# Altium footprint library My Library.PcbLib: 872 footprints (part 53 of 55)
Each footprint in its own frame and in the unit in brackets; x right, y up, seen from the top. Pads: shape width x height; smd on the part's side, far side on the other; paste and mask are expansions set on the pad; w line width, h text height; cw(c..) or ccw(c..) is an arc to the next point about the centre after c.
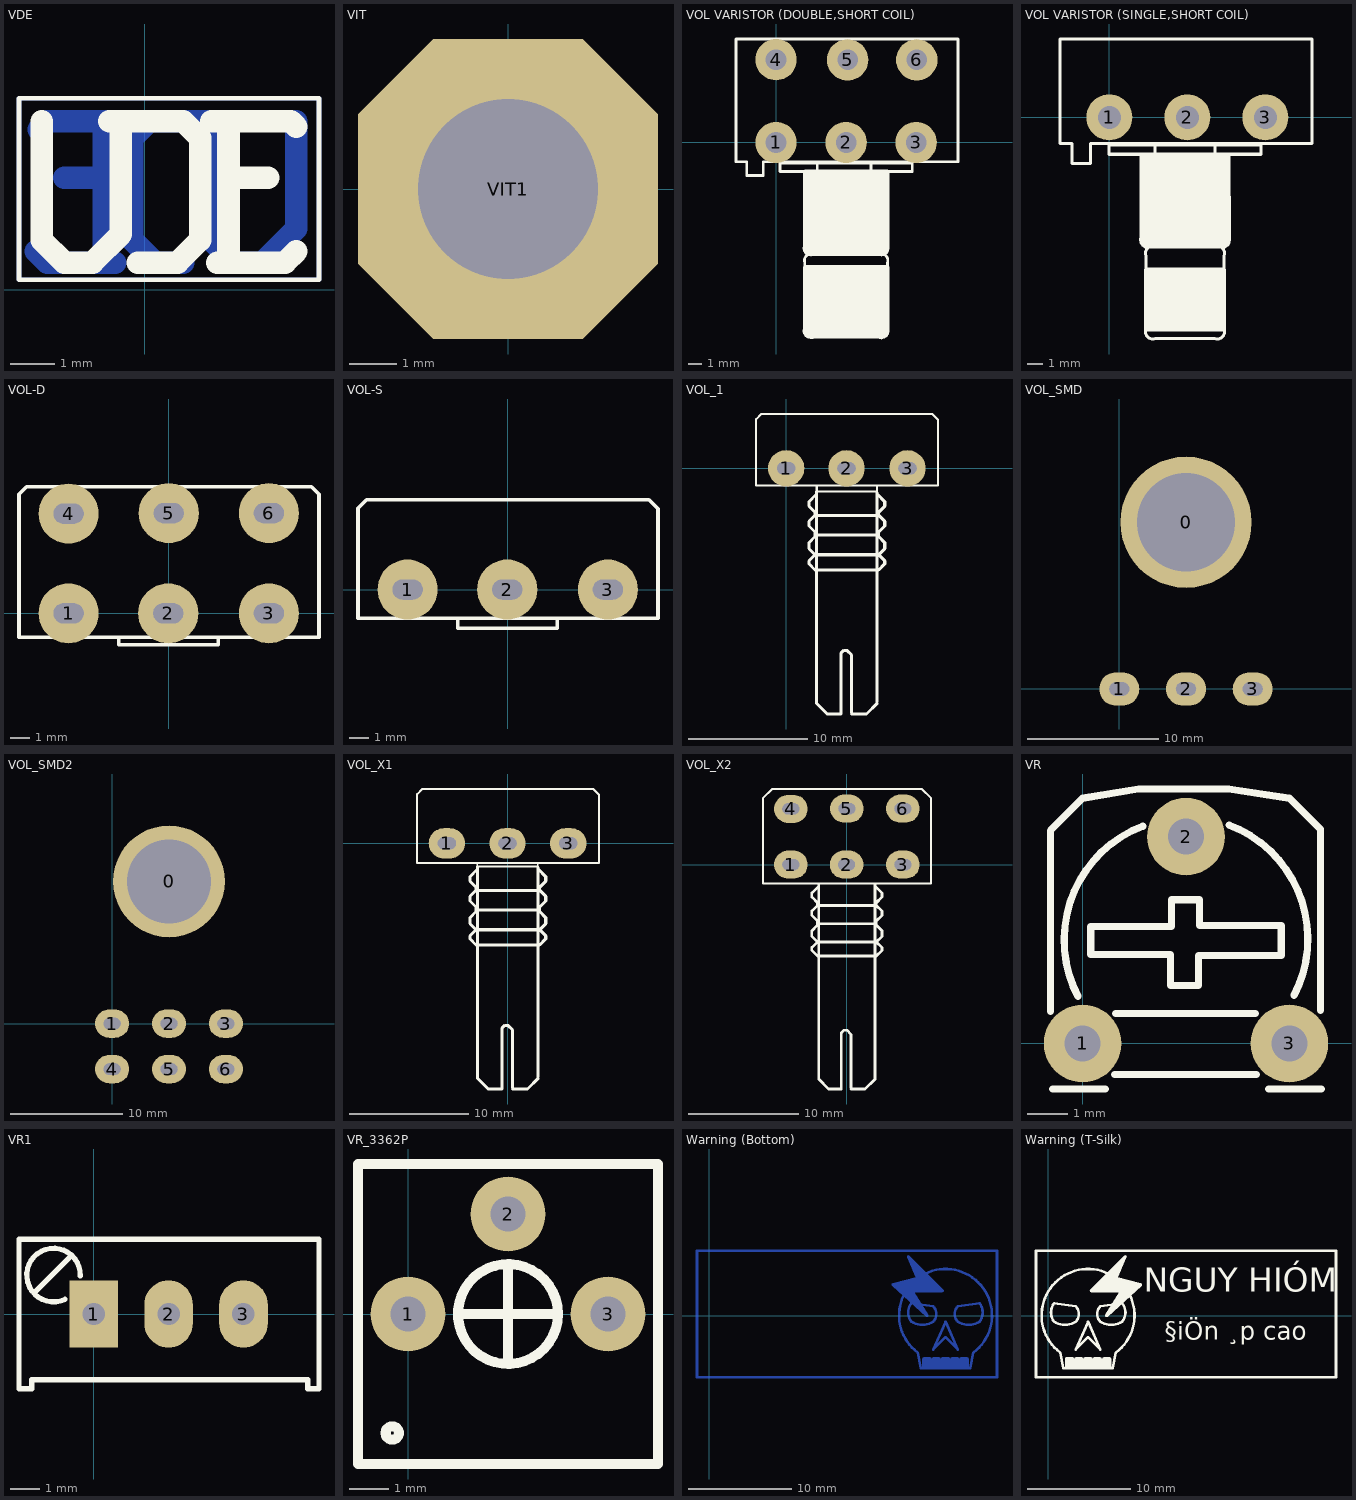
[diagram p52: the footprints below, top view; thin cyan lines are the x and y axes]

## VDE [mm] "VDE - SM"
Bottom Layer:
  lines w0.102: -2.819,0.229 -2.819,4.293 3.912,4.293 3.912,0.229 -2.819,0.229
  lines w0.508: -2.438,0.864 -2.184,0.61 -1.803,0.61 -0.914,0.61 -0.914,3.785 -2.184,3.785 -2.375,3.594 ; -1.803,2.515 -0.914,2.515 ; -1.549,3.785 -0.533,3.785 ; -1.295,0.61 -0.66,0.61 ; 0.864,0.61 0.229,0.61 -0.279,1.118 -0.279,3.404 0.102,3.785 1.753,3.785 ; 1.372,3.785 1.372,1.245 2.007,0.61 2.642,0.61 3.404,1.372 3.404,3.785
Top Overlay:
  lines w0.102: -2.819,0.229 3.912,0.229 3.912,4.293 -2.819,4.293 -2.819,0.229
  lines w0.508: -2.311,3.785 -2.311,1.118 -1.803,0.61 -1.549,0.61 -1.422,0.61 -1.168,0.61 -0.533,1.245 -0.533,3.785 0.864,3.785 1.245,3.404 1.245,1.118 0.737,0.61 -0.152,0.61 ; -0.787,3.785 0.229,3.785 ; 1.499,3.785 2.261,3.785 ; 1.626,0.61 3.15,0.61 3.404,0.864 ; 1.88,0.864 1.88,3.785 3.277,3.785 3.404,3.658 ; 1.88,2.515 2.769,2.515

## VIT [mm] "VIT"
height 0.005
pads (1):
  oct 6.35x6.35 hole 3.81: VIT1(0,0)

## VOL VARISTOR (DOUBLE,SHORT COIL) [mm]
pads (6):
  round 3 hole 1.5: 1(0,0) 2(5.08,0) 3(10.16,0) 4(0,6.003) 5(5.19,5.991) 6(10.201,5.991)
Top Overlay:
  region: 8.119,-2.009 8.158,-2.024 8.158,-2.025 8.174,-2.063 8.19,-2.101 8.193,-7.492 8.221,-7.632 8.217,-7.653 8.221,-7.675 8.184,-7.86 8.172,-7.878 8.168,-7.899 8.063,-8.056 8.045,-8.068 8.033,-8.086 7.876,-8.191 7.855,-8.195 7.837,-8.207 7.652,-8.244 7.631,-8.239 7.61,-8.244 7.459,-8.213 7.457,-8.212 2.691,-8.216 2.55,-8.244 2.529,-8.239 2.507,-8.244 2.322,-8.207 2.304,-8.195 2.283,-8.191 2.126,-8.086 2.114,-8.068 2.096,-8.056 1.991,-7.899 1.987,-7.878 1.975,-7.86 1.938,-7.675 1.943,-7.653 1.938,-7.632 1.968,-7.481 1.97,-7.478 1.97,-2.101 2.002,-2.025 2.079,-1.993 8.081,-1.993
  region: 8.158,-8.928 8.19,-9.004 8.19,-13.482 8.191,-13.484 8.221,-13.635 8.217,-13.656 8.221,-13.677 8.184,-13.863 8.172,-13.881 8.168,-13.902 8.063,-14.059 8.045,-14.071 8.033,-14.088 7.876,-14.193 7.855,-14.198 7.837,-14.21 7.652,-14.246 7.631,-14.242 7.61,-14.246 7.469,-14.218 2.703,-14.214 2.701,-14.216 2.55,-14.246 2.529,-14.242 2.507,-14.246 2.322,-14.209 2.305,-14.197 2.283,-14.193 2.127,-14.088 2.115,-14.07 2.097,-14.058 1.992,-13.901 1.988,-13.88 1.976,-13.862 1.939,-13.677 1.943,-13.656 1.939,-13.635 1.969,-13.484 1.97,-13.482 1.97,-9.004 2.002,-8.928 2.079,-8.896 8.081,-8.896
  lines w0.2: 2.679,-14.107 7.481,-14.107 ccw(c7.631,-13.656) 8.081,-13.506 8.081,-8.704 ccw(c7.631,-8.554) 7.481,-8.103 ; 2.679,-14.106 cw(c2.529,-13.656) 2.079,-13.506 2.079,-8.704 cw(c2.529,-8.554) 2.679,-8.104 ; 2.679,-8.103 cw(c2.529,-7.653) 2.079,-7.504 2.079,-2.101 8.081,-2.101 8.081,-7.504 cw(c7.631,-7.653) 7.481,-8.104 ; 2.679,-8.104 7.481,-8.104 ; 2.679,-8.104 7.481,-8.104 ; -2.897,-1.4 -2.123,-1.4 -2.123,-2.399 -0.923,-2.399 -0.923,-1.4 13.184,-1.4 13.184,7.504 -2.897,7.504 -2.897,-1.4 ; 0.278,-2.101 9.882,-2.101 9.882,-1.501 0.278,-1.501 0.278,-2.101 ; 2.979,-2.101 2.979,-1.501 6.881,-1.501 6.881,-2.101 2.979,-2.101

## VOL VARISTOR (SINGLE,SHORT COIL) [mm]
pads (3):
  round 3 hole 1.5: 1(0,0) 2(5.08,0) 3(10.16,0)
Top Overlay:
  region: 7.558,-9.828 7.589,-9.905 7.589,-13.807 7.558,-13.883 7.481,-13.915 2.379,-13.915 2.302,-13.883 2.271,-13.807 2.271,-9.905 2.302,-9.828 2.379,-9.797 7.481,-9.797
  region: 7.819,-2.309 7.858,-2.325 7.874,-2.363 7.889,-2.401 7.893,-7.792 7.921,-7.932 7.917,-7.954 7.921,-7.975 7.884,-8.16 7.872,-8.178 7.868,-8.199 7.763,-8.356 7.745,-8.368 7.733,-8.386 7.576,-8.491 7.555,-8.495 7.537,-8.507 7.352,-8.544 7.331,-8.539 7.31,-8.544 7.159,-8.514 7.157,-8.512 2.691,-8.516 2.55,-8.544 2.529,-8.54 2.507,-8.544 2.322,-8.507 2.304,-8.495 2.283,-8.491 2.126,-8.386 2.114,-8.368 2.096,-8.356 1.991,-8.199 1.987,-8.178 1.975,-8.16 1.938,-7.975 1.943,-7.954 1.938,-7.932 1.968,-7.781 1.97,-7.778 1.97,-2.401 2.002,-2.325 2.079,-2.293 7.781,-2.293
  lines w0.2: 2.078,-7.804 ccw(c2.529,-7.954) 2.679,-8.404 7.181,-8.404 ccw(c7.331,-7.954) 7.781,-7.804 7.781,-2.401 2.079,-2.401 2.079,-7.804 ; -3.197,-1.7 -2.424,-1.7 -2.424,-3.001 -1.223,-3.001 -1.223,-1.7 13.184,-1.7 13.184,5.102 -3.197,5.102 -3.197,-1.7 ; -0.022,-2.401 -0.022,-1.801 9.882,-1.801 9.882,-2.401 -0.022,-2.401 ; 2.379,-13.807 ccw(c2.829,-13.956) 2.979,-14.406 6.881,-14.407 ccw(c7.031,-13.956) 7.481,-13.807 7.481,-9.004 ccw(c7.031,-8.854) 6.881,-8.404 2.979,-8.404 ccw(c2.829,-8.854) 2.379,-9.004 2.379,-13.807 ; 2.979,-2.401 6.881,-2.401 6.881,-1.801 2.979,-1.801 2.979,-2.401

## VOL-D [mil] "Volume control Dual"
height 400
pads (6):
  round 120 hole 40 slot 60 at 0 deg: 1(-200,0) 2(-1,0) 3(200,0) 4(-200,199) 5(0,200) 6(200,200)
Top Overlay:
  lines w7: -100,-48 -100,-63 99,-63 99,-48 ; -299,-48 300,-48 300,238 285,253 -284,253 -299,238 -299,-48
3D body "SW3dPS-ALPHA-potentiometer stereo PCB mount.STEP": height 834.65, standoff -129.92, extent -338.65,-1309.27 330.65,299

## VOL-S [mil] "Volume control single"
height 400
pads (3):
  round 120 hole 40 slot 60 at 0 deg: 1(-200,0) 2(-1,0) 3(200,0)
Top Overlay:
  lines w7: -100,-57 -100,-77 99,-77 99,-57 ; -299,-57 -299,162 -282,179 282,179 300,161 300,-57 -299,-57

## VOL_1 [mil]
pads (3):
  round 120 hole 40 slot 60 at 0 deg: 1(0,0) 2(199,0) 3(400,0)
Top Overlay:
  lines w7: 100,-57 100,-77 299,-77 299,-57 ; 101,-77 101,-57 ; -99,-57 500,-57 500,161 482,179 -82,179 -99,162 -99,-57
  lines w10: 95,-335 75,-315 75,-305 95,-285 75,-265 75,-245 95,-225 95,-210 75,-190 75,-175 95,-155 95,-145 75,-125 75,-110 100,-85 ; 95,-220 300,-220 ; 100,-770 100,-77 ; 100,-760 100,-775 135,-810 180,-810 180,-610 190,-600 200,-600 215,-615 215,-805 ; 100,-335 305,-335 325,-315 325,-305 305,-285 ; 100,-285 305,-285 ; 105,-155 300,-155 ; 215,-810 265,-810 300,-775 ; 300,-770 300,-80 ; 300,-85 325,-110 325,-125 305,-145 305,-155 325,-175 325,-190 305,-210 305,-225 325,-245 325,-265 305,-285
3D body "SW3dPS-Pot.STEP": height 839.35, standoff -130, extent -110,-818.11 510,188.11

## VOL_SMD [mil]
pads (4):
  round 393.7 hole 295.28: 0(200,500)
  oval 120x100 hole 40 slot 60 at 0 deg: 1(0,0) 2(200,0) 3(400,0)
Bottom Overlay:
  circle w12: c200,500 r215.01
  circle w12: c0,150 r50
  circle w12: c200,150 r50
  circle w12: c400,150 r50
  lines w12: -57.25,301.71 cw(c200,500) 455.57,299.55 ; -55,299 127,299 ; -49,700 119,700 ; 281,298 455,298 ; 286,698 454,698 ; 455,295 500,250 500,-75 -100,-75 -100,255 ; -100,255 -55,300 -100,255
3D body "SW3dPS-omeg pot.STEP": height 866.14, standoff -407.48, extent -203.15,-247.08 600,947.08

## VOL_SMD2 [mil]
pads (7):
  round 393.7 hole 295.28: 0(200,500)
  oval 120x100 hole 40 slot 60 at 0 deg: 1(0,0) 2(200,0) 3(400,0) 4(0,-160) 5(200,-160) 6(400,-160)
Bottom Overlay:
  circle w12: c400,150 r50
  circle w12: c200,150 r50
  circle w12: c0,150 r50
  circle w12: c200,500 r215.01
  lines w12: -100,-70 -100,-230 500,-230 500,-70 ; -57.25,301.71 cw(c200,500) 455.57,299.55 ; -55,299 127,299 ; -49,700 119,700 ; 281,298 455,298 ; 286,698 454,698 ; 455,295 500,250 500,-75 -100,-75 -100,255 ; -100,255 -55,300 -100,255

## VOL_X1 [mil]
pads (3):
  oval 120x100 hole 40 slot 60 at 0 deg: 1(-200,0) 2(0,0) 3(200,0)
Top Overlay:
  lines w5: -100,-65 -100,-77 -99,-77 ; 100,-77 100,-65
  lines w7: -99,-77 100,-77 ; -298,-65 301,-65 301,161 283,179 -281,179 -298,162 -298,-65
  lines w10: -104,-335 -124,-315 -124,-305 -104,-285 -124,-265 -124,-245 -104,-225 -104,-210 -124,-190 -124,-175 -104,-155 -104,-145 -124,-125 -124,-110 -99,-85 ; -104,-220 101,-220 ; -99,-770 -99,-77 ; -99,-760 -99,-775 -64,-810 -19,-810 -19,-610 -9,-600 1,-600 16,-615 16,-805 ; -99,-335 106,-335 126,-315 126,-305 106,-285 ; -99,-285 106,-285 ; -94,-155 101,-155 ; 16,-810 66,-810 101,-775 ; 101,-770 101,-80 ; 101,-85 126,-110 126,-125 106,-145 106,-155 126,-175 126,-190 106,-210 106,-225 126,-245 126,-265 106,-285
3D body "SW3dPS-Pot.STEP": height 839.35, standoff -130, extent -310,-812.22 310,194

## VOL_X2 [mil] "Volume control Dual"
height 400
pads (6):
  oval 120x100 hole 40 slot 60 at 0 deg: 1(-200,0) 2(-1,0) 3(200,0) 4(-200,199) 5(0,200) 6(200,200)
Top Overlay:
  lines w7: -299,-68 -299,238 -267,270 268,270 300,238 300,-68 -299,-68
  lines w10: -105,-326 -125,-306 -125,-296 -105,-276 -125,-256 -125,-236 -105,-216 -105,-201 -125,-181 -125,-166 -105,-146 -105,-136 -125,-116 -125,-101 -100,-76 ; -105,-211 100,-211 ; -100,-761 -100,-68 ; -100,-751 -100,-766 -65,-801 -20,-801 -20,-601 -10,-591 0,-591 15,-606 15,-796 ; -100,-326 105,-326 125,-306 125,-296 105,-276 ; -100,-276 105,-276 ; -95,-146 100,-146 ; 15,-801 65,-801 100,-766 ; 100,-761 100,-71 ; 100,-76 125,-101 125,-116 105,-136 105,-146 125,-166 125,-181 105,-201 105,-216 125,-236 125,-256 105,-276
3D body "SW3dPS-ALPHA-potentiometer stereo PCB mount.STEP": height 834.65, standoff -129.92, extent -335.64,-1325.41 333.65,282.86

## VR [mil] "Resistor Variable"
height 200
pads (3):
  round 75 hole 35: 1(0,0) 2(100,200) 3(200,0)
Top Overlay:
  lines w7: -31,31 -31,206 0,237 54,246 141.5,246 200,237 230,207 230,32 ; -29,-44 22,-44 ; -4.35,45.34 cw(c100,100) 58.1,210.1 ; 8,113 8,86 85,86 85,56 112,56 112,85 192,85 192,114 113,114 113,139 86,139 86,113 9,113 ; 31,-30 168,-30 ; 32,29 167,29 ; 141.9,211.1 cw(c100,101) 204.35,46.34 ; 180,-44 231,-44
3D body "SW3dPS-Trimpot Horizontal.STEP": height 165.35, standoff -220.47, extent -86.85,-30 306.85,371.57

## VR1 [mil] "Variable Resistor"
height 400
pads (3):
  rect 65x90 hole 30: 1(0,0)
  oval 65x90 hole 30: 2(100,0) 3(200,0)
Top Overlay:
  lines w7: -80,28 -30,78 ; -38.6,19.63 cw(c-53.79,52.05) -18.01,50.77 ; -100,-100 -100,100 301,100 301,-100 286,-100 286,-88 -83,-88 -83,-100 -100,-100
3D body "SW3dPS-Bourns_3299W.STEP": height 455, standoff -45, extent -87.5,-130 287.5,110

## VR_3362P [mil] "Resistor Variable"
height 200
pads (3):
  round 75 hole 35: 1(0,0) 2(100,100) 3(200,0)
Top Overlay:
  circle w10: c100,0 r50
  circle w10: c-15.71,-119 r6.71
  lines w10: 50,0 150,0 ; 100,-50 100,50 ; -50,-150 -50,150 250,150 250,-150 -50,-150
3D body "User Library-Bourns 3362P.STEP": height 185.04, standoff -215.35, extent -29.92,-147.79 229.92,129.92

## Warning (Bottom) [mm]
Bottom Layer:
  region: 22.544,-4.105 22.504,-4.202 22.504,-5.102 22.544,-5.2 22.641,-5.24 23.241,-5.24 23.338,-5.2 23.378,-5.102 23.378,-4.202 23.338,-4.105 23.241,-4.065 22.641,-4.065
  region: 23.444,-4.105 23.404,-4.202 23.404,-5.102 23.444,-5.2 23.542,-5.24 24.142,-5.24 24.239,-5.2 24.279,-5.102 24.279,-4.202 24.239,-4.105 24.142,-4.065 23.542,-4.065
  region: 20.743,-4.105 20.703,-4.202 20.703,-5.102 20.743,-5.2 20.84,-5.24 21.441,-5.24 21.538,-5.2 21.578,-5.102 21.578,-4.202 21.538,-4.105 21.441,-4.065 20.84,-4.065
  region: 21.644,-4.105 21.603,-4.202 21.603,-5.102 21.644,-5.2 21.741,-5.24 22.341,-5.24 22.438,-5.2 22.478,-5.102 22.478,-4.202 22.438,-4.105 22.341,-4.065 21.741,-4.065
  region: 24.345,-4.105 24.305,-4.202 24.305,-5.102 24.345,-5.2 24.442,-5.24 25.042,-5.24 25.139,-5.2 25.18,-5.102 25.18,-4.202 25.139,-4.105 25.042,-4.065 24.442,-4.065
  region: 19.314,5.829 19.285,5.829 19.267,5.81 19.242,5.8 19.232,5.774 19.212,5.754 19.212,5.727 19.202,5.703 19.213,5.677 19.213,5.649 20.05,3.696 17.806,3.135 17.773,3.111 17.737,3.094 17.732,3.081 17.721,3.073 17.715,3.033 17.702,2.995 17.708,2.983 17.705,2.969 17.729,2.936 17.746,2.9 21.048,-0.102 21.081,-0.114 21.11,-0.134 21.129,-0.131 21.147,-0.137 21.179,-0.122 21.213,-0.117 21.225,-0.101 21.242,-0.092 21.254,-0.059 21.274,-0.031 21.271,-0.012 21.278,0.007 21.263,0.038 21.257,0.073 19.888,2.264 22.641,2.264 22.738,2.304 22.779,2.401 22.738,2.498 19.437,5.8 19.411,5.811 19.391,5.83 19.364,5.83 19.34,5.84
  lines w0.254: -1.201,-6.003 -1.201,6.303 27.94,6.303 27.94,-6.003 -1.201,-6.003 ; 17.839,3.002 21.14,0 19.64,2.401 22.641,2.401 19.34,5.703 20.24,3.602 17.839,3.002 ; 19.64,-0.6 cw(c20.69,0.3) 19.64,1.201 21.741,0.9 cw(c20.991,0.15) 21.741,-0.6 cw(c20.69,1.05) 19.64,-0.6 ; 20.24,-3.602 cw(c22.941,0.014) 25.643,-3.602 25.342,-5.102 20.54,-5.102 20.24,-3.602 ; 21.741,-3.302 22.941,-2.101 24.142,-3.302 22.941,-0.6 21.741,-3.302 ; 24.142,-0.6 ccw(c25.193,1.05) 26.243,-0.6 ccw(c25.042,0.3) 26.243,1.201 24.142,0.9 ccw(c24.892,0.15) 24.142,-0.6
  text "NGUY HIÓM" at 17.526,1.143 h4
  text "§iÖn ¸p cao" at 14.732,-3.048 h3

## Warning (T-Silk) [mm]
Top Overlay:
  region: 7.483,5.829 7.512,5.829 7.53,5.81 7.555,5.8 7.565,5.774 7.585,5.754 7.585,5.727 7.595,5.703 7.584,5.677 7.584,5.649 6.747,3.696 8.991,3.135 9.024,3.111 9.06,3.094 9.065,3.081 9.076,3.073 9.082,3.033 9.095,2.995 9.089,2.983 9.092,2.969 9.068,2.936 9.051,2.9 5.749,-0.102 5.716,-0.114 5.687,-0.134 5.668,-0.131 5.65,-0.137 5.618,-0.122 5.584,-0.117 5.572,-0.101 5.555,-0.092 5.543,-0.059 5.523,-0.031 5.526,-0.012 5.519,0.007 5.534,0.038 5.54,0.073 6.909,2.264 4.156,2.264 4.059,2.304 4.018,2.401 4.059,2.498 7.36,5.8 7.386,5.811 7.406,5.83 7.433,5.83 7.457,5.84
  region: 2.452,-4.105 2.492,-4.202 2.492,-5.102 2.452,-5.2 2.355,-5.24 1.755,-5.24 1.658,-5.2 1.617,-5.102 1.617,-4.202 1.658,-4.105 1.755,-4.065 2.355,-4.065
  region: 5.153,-4.105 5.194,-4.202 5.194,-5.102 5.153,-5.2 5.056,-5.24 4.456,-5.24 4.359,-5.2 4.319,-5.102 4.319,-4.202 4.359,-4.105 4.456,-4.065 5.056,-4.065
  region: 6.054,-4.105 6.094,-4.202 6.094,-5.102 6.054,-5.2 5.957,-5.24 5.356,-5.24 5.259,-5.2 5.219,-5.102 5.219,-4.202 5.259,-4.105 5.356,-4.065 5.957,-4.065
  region: 3.353,-4.105 3.393,-4.202 3.393,-5.102 3.353,-5.2 3.255,-5.24 2.655,-5.24 2.558,-5.2 2.518,-5.102 2.518,-4.202 2.558,-4.105 2.655,-4.065 3.255,-4.065
  region: 4.253,-4.105 4.293,-4.202 4.293,-5.102 4.253,-5.2 4.156,-5.24 3.556,-5.24 3.459,-5.2 3.419,-5.102 3.419,-4.202 3.459,-4.105 3.556,-4.065 4.156,-4.065
  lines w0.254: -1.201,-6.003 27.94,-6.003 27.94,6.303 -1.201,6.303 -1.201,-6.003 ; 0.554,-0.6 cw(c1.755,0.3) 0.554,1.201 2.655,0.9 cw(c1.905,0.15) 2.655,-0.6 cw(c1.604,1.05) 0.554,-0.6 ; 1.154,-3.602 cw(c3.856,0.014) 6.557,-3.602 6.257,-5.102 1.455,-5.102 1.154,-3.602 ; 2.655,-3.302 3.856,-2.101 5.056,-3.302 3.856,-0.6 2.655,-3.302 ; 4.156,2.401 7.157,2.401 5.657,0 8.958,3.002 6.557,3.602 7.457,5.703 4.156,2.401 ; 5.056,-0.6 ccw(c6.107,1.05) 7.157,-0.6 ccw(c6.107,0.3) 7.157,1.201 5.056,0.9 ccw(c5.806,0.15) 5.056,-0.6
  text "§iÖn ¸p cao" at 11.303,-2.921 h3
  text "NGUY HIÓM" at 9.271,1.524 h4